# Altium footprint library Package_QFP.PcbLib: 84 footprints (part 5 of 6)
Each footprint in its own frame and in the unit in brackets; x right, y up, seen from the top. Pads: shape width x height; smd on the part's side, far side on the other; paste and mask are expansions set on the pad; w line width, h text height; cw(c..) or ccw(c..) is an arc to the next point about the centre after c.
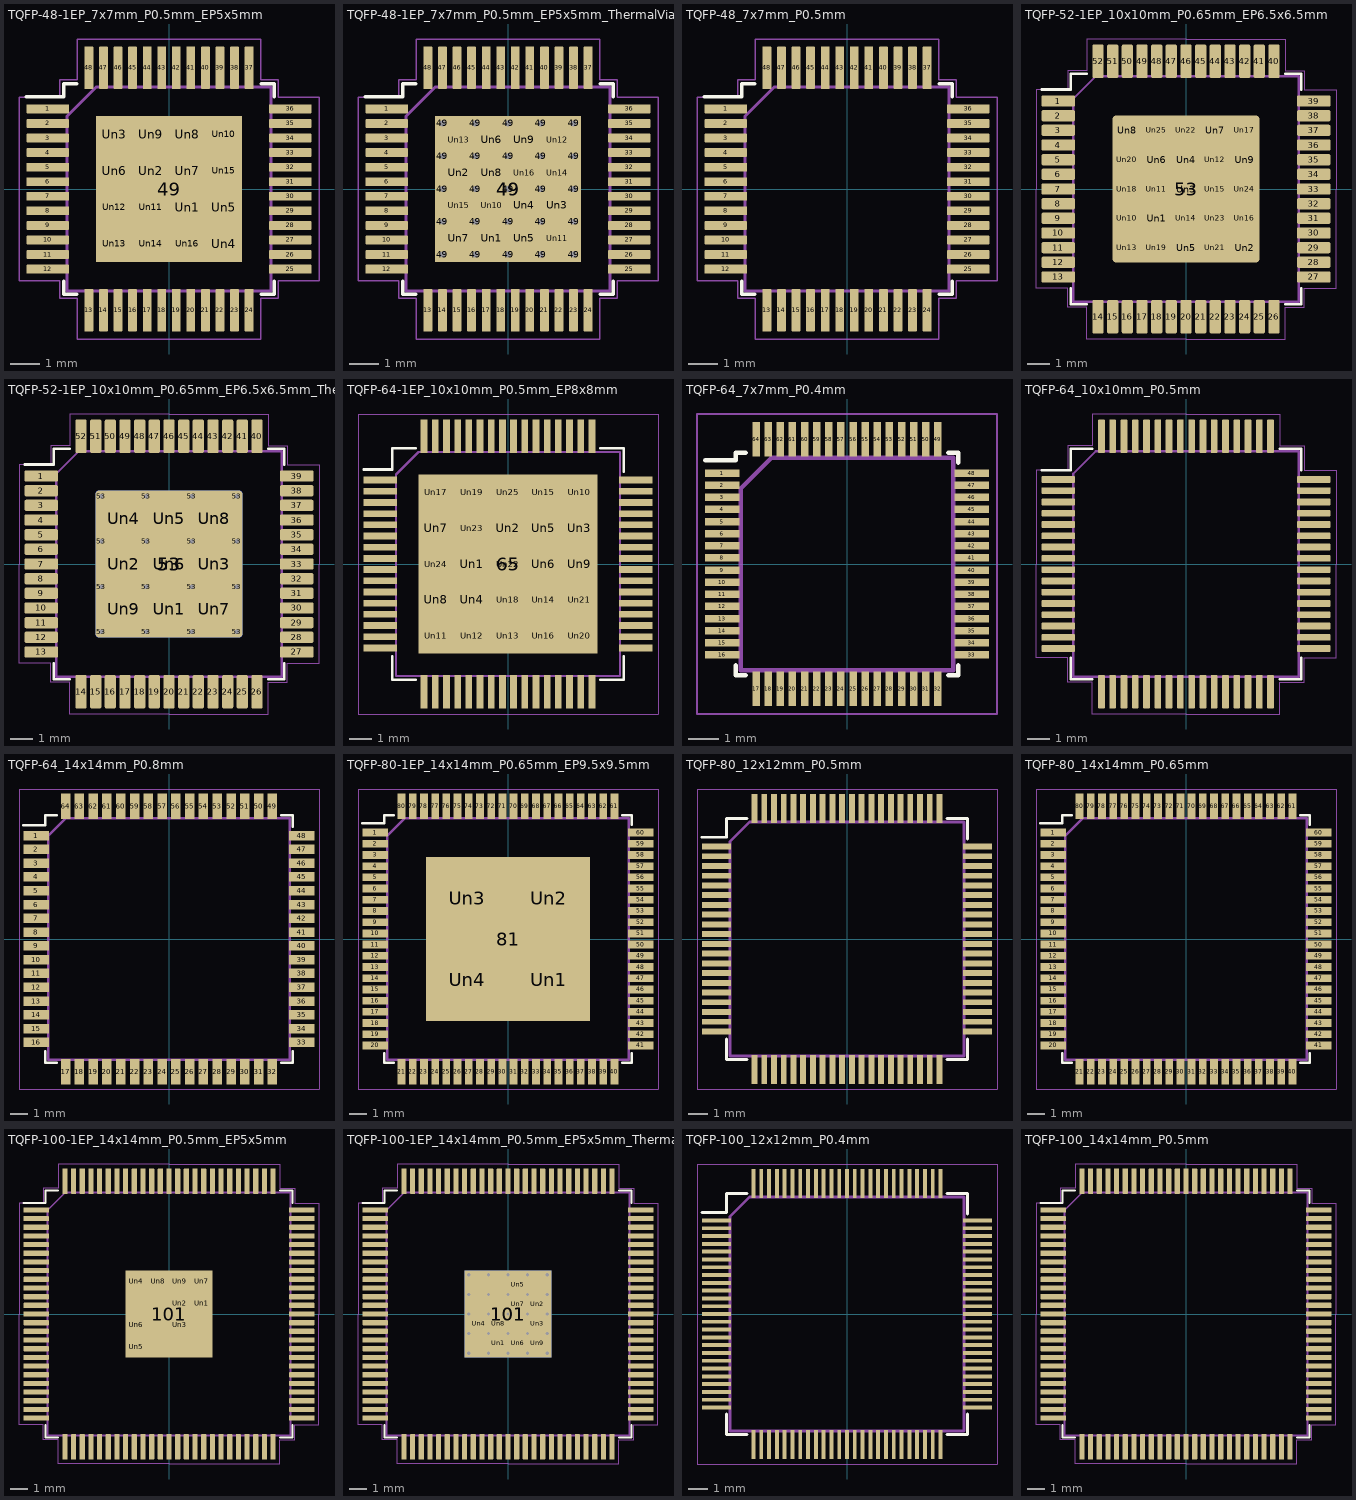
[diagram p4: the footprints below, top view; thin cyan lines are the x and y axes]

## TQFP-48-1EP_7x7mm_P0.5mm_EP5x5mm [mm]
pads (65):
  rrect25% 1.475x0.3 smd: 1(-4.163,2.75) 2(-4.163,2.25) 3(-4.163,1.75) 4(-4.163,1.25) 5(-4.163,0.75) 6(-4.163,0.25) 7(-4.163,-0.25) 8(-4.163,-0.75) 9(-4.163,-1.25) 10(-4.163,-1.75) 11(-4.163,-2.25) 12(-4.163,-2.75) 25(4.163,-2.75) 26(4.163,-2.25) 27(4.163,-1.75) 28(4.163,-1.25) 29(4.163,-0.75) 30(4.163,-0.25) 31(4.163,0.25) 32(4.163,0.75) 33(4.163,1.25) 34(4.163,1.75) 35(4.163,2.25) 36(4.163,2.75)
  rrect25% 0.3x1.475 smd: 13(-2.75,-4.163) 14(-2.25,-4.163) 15(-1.75,-4.163) 16(-1.25,-4.163) 17(-0.75,-4.163) 18(-0.25,-4.163) 19(0.25,-4.163) 20(0.75,-4.163) 21(1.25,-4.163) 22(1.75,-4.163) 23(2.25,-4.163) 24(2.75,-4.163) 37(2.75,4.163) 38(2.25,4.163) 39(1.75,4.163) 40(1.25,4.163) 41(0.75,4.163) 42(0.25,4.163) 43(-0.25,4.163) 44(-0.75,4.163) 45(-1.25,4.163) 46(-1.75,4.163) 47(-2.25,4.163) 48(-2.75,4.163)
  rect 5x5 smd: 49(0,0)
  rrect25% 1.01x1.01 on Top Paste: Un1(0.625,-0.625) Un2(-0.625,0.625) Un3(-1.875,1.875) Un4(1.875,-1.875) Un5(1.875,-0.625) Un6(-1.875,0.625) Un7(0.625,0.625) Un8(0.625,1.875) Un9(-0.625,1.875) Un10(1.875,1.875) Un11(-0.625,-0.625) Un12(-1.875,-0.625) Un13(-1.875,-1.875) Un14(-0.625,-1.875) Un15(1.875,0.625) Un16(0.625,-1.875)
F.SilkS:
  lines w0.12: -4.9,3.16 -3.61,3.16 -3.61,3.61 -3.16,3.61 ; -3.61,-3.16 -3.61,-3.61 -3.16,-3.61 ; 3.16,-3.61 3.61,-3.61 3.61,-3.16 ; 3.16,3.61 3.61,3.61 3.61,3.16
F.CrtYd:
  lines w0.05: -5.15,-3.15 -5.15,0 -5.15,3.15 -3.75,3.15 -3.75,3.75 -3.15,3.75 -3.15,5.15 0,5.15 3.15,5.15 3.15,3.75 3.75,3.75 3.75,3.15 5.15,3.15 5.15,0 5.15,-3.15 3.75,-3.15 3.75,-3.75 3.15,-3.75 3.15,-5.15 0,-5.15 -3.15,-5.15 -3.15,-3.75 -3.75,-3.75 -3.75,-3.15 -5.15,-3.15
F.Fab:
  lines w0.1: -3.5,-3.5 3.5,-3.5 3.5,3.5 -2.5,3.5 -3.5,2.5 -3.5,-3.5
  text "'.Designator'" at -4.047,-0.84 h1

## TQFP-48-1EP_7x7mm_P0.5mm_EP5x5mm_ThermalVias [mm]
pads (91):
  rrect25% 1.475x0.3 smd: 1(-4.163,2.75) 2(-4.163,2.25) 3(-4.163,1.75) 4(-4.163,1.25) 5(-4.163,0.75) 6(-4.163,0.25) 7(-4.163,-0.25) 8(-4.163,-0.75) 9(-4.163,-1.25) 10(-4.163,-1.75) 11(-4.163,-2.25) 12(-4.163,-2.75) 25(4.163,-2.75) 26(4.163,-2.25) 27(4.163,-1.75) 28(4.163,-1.25) 29(4.163,-0.75) 30(4.163,-0.25) 31(4.163,0.25) 32(4.163,0.75) 33(4.163,1.25) 34(4.163,1.75) 35(4.163,2.25) 36(4.163,2.75)
  rrect25% 0.3x1.475 smd: 13(-2.75,-4.163) 14(-2.25,-4.163) 15(-1.75,-4.163) 16(-1.25,-4.163) 17(-0.75,-4.163) 18(-0.25,-4.163) 19(0.25,-4.163) 20(0.75,-4.163) 21(1.25,-4.163) 22(1.75,-4.163) 23(2.25,-4.163) 24(2.75,-4.163) 37(2.75,4.163) 38(2.25,4.163) 39(1.75,4.163) 40(1.25,4.163) 41(0.75,4.163) 42(0.25,4.163) 43(-0.25,4.163) 44(-0.75,4.163) 45(-1.25,4.163) 46(-1.75,4.163) 47(-2.25,4.163) 48(-2.75,4.163)
  round 0.5 hole 0.2: 49(-2.25,-2.25) 49(-2.25,-1.125) 49(-2.25,0) 49(-2.25,1.125) 49(-2.25,2.25) 49(-1.125,-2.25) 49(-1.125,-1.125) 49(-1.125,0) 49(-1.125,1.125) 49(-1.125,2.25) 49(0,-2.25) 49(0,-1.125) 49(0,0) 49(0,1.125) 49(0,2.25) 49(1.125,-2.25) 49(1.125,-1.125) 49(1.125,0) 49(1.125,1.125) 49(1.125,2.25) 49(2.25,-2.25) 49(2.25,-1.125) 49(2.25,0) 49(2.25,1.125) 49(2.25,2.25)
  rect 5x5 smd: 49(0,0)
  rect 5x5 smd far side: 49(0,0)
  round 0.891 on Top Paste: Un1(-0.563,-1.687) Un2(-1.687,0.563) Un3(1.687,-0.563) Un4(0.563,-0.563) Un5(0.563,-1.687) Un6(-0.563,1.687) Un7(-1.687,-1.687) Un8(-0.563,0.563) Un9(0.563,1.687) Un10(-0.563,-0.563) Un11(1.687,-1.687) Un12(1.687,1.687) Un13(-1.687,1.687) Un14(1.687,0.563) Un15(-1.687,-0.563) Un16(0.563,0.563)
F.SilkS:
  lines w0.12: -4.9,3.16 -3.61,3.16 -3.61,3.61 -3.16,3.61 ; -3.61,-3.16 -3.61,-3.61 -3.16,-3.61 ; 3.16,-3.61 3.61,-3.61 3.61,-3.16 ; 3.16,3.61 3.61,3.61 3.61,3.16
F.Paste:
  region: 0.949,0.852 0.949,0.273 0.852,0.176 0.273,0.176 0.176,0.273 0.176,0.852 0.273,0.949 0.852,0.949
  region: -1.301,-0.273 -1.301,-0.852 -1.398,-0.949 -1.977,-0.949 -2.074,-0.852 -2.074,-0.273 -1.977,-0.176 -1.398,-0.176
  region: 2.074,0.852 2.074,0.273 1.977,0.176 1.398,0.176 1.301,0.273 1.301,0.852 1.398,0.949 1.977,0.949
  region: -1.301,1.977 -1.301,1.398 -1.398,1.301 -1.977,1.301 -2.074,1.398 -2.074,1.977 -1.977,2.074 -1.398,2.074
  region: 2.074,1.977 2.074,1.398 1.977,1.301 1.398,1.301 1.301,1.398 1.301,1.977 1.398,2.074 1.977,2.074
  region: 2.074,-1.398 2.074,-1.977 1.977,-2.074 1.398,-2.074 1.301,-1.977 1.301,-1.398 1.398,-1.301 1.977,-1.301
  region: -0.176,-0.273 -0.176,-0.852 -0.273,-0.949 -0.852,-0.949 -0.949,-0.852 -0.949,-0.273 -0.852,-0.176 -0.273,-0.176
  region: 0.949,1.977 0.949,1.398 0.852,1.301 0.273,1.301 0.176,1.398 0.176,1.977 0.273,2.074 0.852,2.074
  region: -0.176,0.852 -0.176,0.273 -0.273,0.176 -0.852,0.176 -0.949,0.273 -0.949,0.852 -0.852,0.949 -0.273,0.949
  region: -1.301,-1.398 -1.301,-1.977 -1.398,-2.074 -1.977,-2.074 -2.074,-1.977 -2.074,-1.398 -1.977,-1.301 -1.398,-1.301
  region: -0.176,1.977 -0.176,1.398 -0.273,1.301 -0.852,1.301 -0.949,1.398 -0.949,1.977 -0.852,2.074 -0.273,2.074
  region: 0.949,-1.398 0.949,-1.977 0.852,-2.074 0.273,-2.074 0.176,-1.977 0.176,-1.398 0.273,-1.301 0.852,-1.301
  region: 0.949,-0.273 0.949,-0.852 0.852,-0.949 0.273,-0.949 0.176,-0.852 0.176,-0.273 0.273,-0.176 0.852,-0.176
  region: 2.074,-0.273 2.074,-0.852 1.977,-0.949 1.398,-0.949 1.301,-0.852 1.301,-0.273 1.398,-0.176 1.977,-0.176
  region: -1.301,0.852 -1.301,0.273 -1.398,0.176 -1.977,0.176 -2.074,0.273 -2.074,0.852 -1.977,0.949 -1.398,0.949
  region: -0.176,-1.398 -0.176,-1.977 -0.273,-2.074 -0.852,-2.074 -0.949,-1.977 -0.949,-1.398 -0.852,-1.301 -0.273,-1.301
F.CrtYd:
  lines w0.05: -5.15,-3.15 -3.75,-3.15 -3.75,-3.75 -3.15,-3.75 -3.15,-5.15 0,-5.15 3.15,-5.15 3.15,-3.75 3.75,-3.75 3.75,-3.15 5.15,-3.15 5.15,0 5.15,3.15 3.75,3.15 3.75,3.75 3.15,3.75 3.15,5.15 0,5.15 -3.15,5.15 -3.15,3.75 -3.75,3.75 -3.75,3.15 -5.15,3.15 -5.15,0 -5.15,-3.15
F.Fab:
  lines w0.1: -3.5,-3.5 3.5,-3.5 3.5,3.5 -2.5,3.5 -3.5,2.5 -3.5,-3.5
  text "'.Designator'" at -4.047,-0.84 h1

## TQFP-48_7x7mm_P0.5mm [mm]
pads (48):
  rrect25% 1.475x0.3 smd mask+0.051: 1(-4.163,2.75) 2(-4.163,2.25) 3(-4.163,1.75) 4(-4.163,1.25) 5(-4.163,0.75) 6(-4.163,0.25) 7(-4.163,-0.25) 8(-4.163,-0.75) 9(-4.163,-1.25) 10(-4.163,-1.75) 11(-4.163,-2.25) 12(-4.163,-2.75) 25(4.163,-2.75) 26(4.163,-2.25) 27(4.163,-1.75) 28(4.163,-1.25) 29(4.163,-0.75) 30(4.163,-0.25) 31(4.163,0.25) 32(4.163,0.75) 33(4.163,1.25) 34(4.163,1.75) 35(4.163,2.25) 36(4.163,2.75)
  rrect25% 0.3x1.475 smd mask+0.051: 13(-2.75,-4.163) 14(-2.25,-4.163) 15(-1.75,-4.163) 16(-1.25,-4.163) 17(-0.75,-4.163) 18(-0.25,-4.163) 19(0.25,-4.163) 20(0.75,-4.163) 21(1.25,-4.163) 22(1.75,-4.163) 23(2.25,-4.163) 24(2.75,-4.163) 37(2.75,4.163) 38(2.25,4.163) 39(1.75,4.163) 40(1.25,4.163) 41(0.75,4.163) 42(0.25,4.163) 43(-0.25,4.163) 44(-0.75,4.163) 45(-1.25,4.163) 46(-1.75,4.163) 47(-2.25,4.163) 48(-2.75,4.163)
F.SilkS:
  lines w0.12: -4.9,3.16 -3.61,3.16 -3.61,3.61 -3.16,3.61 ; -3.61,-3.16 -3.61,-3.61 -3.16,-3.61 ; 3.16,-3.61 3.61,-3.61 3.61,-3.16 ; 3.16,3.61 3.61,3.61 3.61,3.16
F.CrtYd:
  lines w0.05: -5.15,-3.15 -3.75,-3.15 -3.75,-3.75 -3.15,-3.75 -3.15,-5.15 0,-5.15 3.15,-5.15 3.15,-3.75 3.75,-3.75 3.75,-3.15 5.15,-3.15 5.15,0 5.15,3.15 3.75,3.15 3.75,3.75 3.15,3.75 3.15,5.15 0,5.15 -3.15,5.15 -3.15,3.75 -3.75,3.75 -3.75,3.15 -5.15,3.15 -5.15,0 -5.15,-3.15
F.Fab:
  lines w0.1: -3.5,-3.5 -3.5,2.5 -2.5,3.5 3.5,3.5 3.5,-3.5 -3.5,-3.5
  text "'.Designator'" at -4.047,-0.84 h1

## TQFP-52-1EP_10x10mm_P0.65mm_EP6.5x6.5mm [mm]
pads (78):
  rrect25% 1.475x0.5 smd: 1(-5.663,3.9) 2(-5.663,3.25) 3(-5.663,2.6) 4(-5.663,1.95) 5(-5.663,1.3) 6(-5.663,0.65) 7(-5.663,0) 8(-5.663,-0.65) 9(-5.663,-1.3) 10(-5.663,-1.95) 11(-5.663,-2.6) 12(-5.663,-3.25) 13(-5.663,-3.9) 27(5.663,-3.9) 28(5.663,-3.25) 29(5.663,-2.6) 30(5.663,-1.95) 31(5.663,-1.3) 32(5.663,-0.65) 33(5.663,0) 34(5.663,0.65) 35(5.663,1.3) 36(5.663,1.95) 37(5.663,2.6) 38(5.663,3.25) 39(5.663,3.9)
  rrect25% 0.5x1.475 smd: 14(-3.9,-5.663) 15(-3.25,-5.663) 16(-2.6,-5.663) 17(-1.95,-5.663) 18(-1.3,-5.663) 19(-0.65,-5.663) 20(0,-5.663) 21(0.65,-5.663) 22(1.3,-5.663) 23(1.95,-5.663) 24(2.6,-5.663) 25(3.25,-5.663) 26(3.9,-5.663) 40(3.9,5.663) 41(3.25,5.663) 42(2.6,5.663) 43(1.95,5.663) 44(1.3,5.663) 45(0.65,5.663) 46(0,5.663) 47(-0.65,5.663) 48(-1.3,5.663) 49(-1.95,5.663) 50(-2.6,5.663) 51(-3.25,5.663) 52(-3.9,5.663)
  rrect4% 6.5x6.5 smd: 53(0,0)
  rrect24% 1.05x1.05 on Top Paste: Un1(-1.3,-1.3) Un2(2.6,-2.6) Un3(0,0) Un4(0,1.3) Un5(0,-2.6) Un6(-1.3,1.3) Un7(1.3,2.6) Un8(-2.6,2.6) Un9(2.6,1.3) Un10(-2.6,-1.3) Un11(-1.3,0) Un12(1.3,1.3) Un13(-2.6,-2.6) Un14(0,-1.3) Un15(1.3,0) Un16(2.6,-1.3) Un17(2.6,2.6) Un18(-2.6,0) Un19(-1.3,-2.6) Un20(-2.6,1.3) Un21(1.3,-2.6) Un22(0,2.6) Un23(1.3,-1.3) Un24(2.6,0) Un25(-1.3,2.6)
F.SilkS:
  lines w0.12: -6.4,4.41 -5.11,4.41 -5.11,5.11 -4.41,5.11 ; -5.11,-4.41 -5.11,-5.11 -4.41,-5.11 ; 4.41,-5.11 5.11,-5.11 5.11,-4.41 ; 4.41,5.11 5.11,5.11 5.11,4.41
F.CrtYd:
  lines w0.05: -6.65,-4.4 -6.65,0 -6.65,4.4 -5.25,4.4 -5.25,5.25 -4.4,5.25 -4.4,6.65 0,6.65 4.4,6.65 4.4,5.25 5.25,5.25 5.25,4.4 6.65,4.4 6.65,0 6.65,-4.4 5.25,-4.4 5.25,-5.25 4.4,-5.25 4.4,-6.65 0,-6.65 -4.4,-6.65 -4.4,-5.25 -5.25,-5.25 -5.25,-4.4 -6.65,-4.4
F.Fab:
  lines w0.1: -5,-5 -5,4 -4,5 5,5 5,-5 -5,-5
  text "'.Designator'" at -4.047,-0.84 h1

## TQFP-52-1EP_10x10mm_P0.65mm_EP6.5x6.5mm_ThermalVias [mm]
pads (79):
  rrect25% 1.475x0.5 smd: 1(-5.663,3.9) 2(-5.663,3.25) 3(-5.663,2.6) 4(-5.663,1.95) 5(-5.663,1.3) 6(-5.663,0.65) 7(-5.663,0) 8(-5.663,-0.65) 9(-5.663,-1.3) 10(-5.663,-1.95) 11(-5.663,-2.6) 12(-5.663,-3.25) 13(-5.663,-3.9) 27(5.663,-3.9) 28(5.663,-3.25) 29(5.663,-2.6) 30(5.663,-1.95) 31(5.663,-1.3) 32(5.663,-0.65) 33(5.663,0) 34(5.663,0.65) 35(5.663,1.3) 36(5.663,1.95) 37(5.663,2.6) 38(5.663,3.25) 39(5.663,3.9)
  rrect25% 0.5x1.475 smd: 14(-3.9,-5.663) 15(-3.25,-5.663) 16(-2.6,-5.663) 17(-1.95,-5.663) 18(-1.3,-5.663) 19(-0.65,-5.663) 20(0,-5.663) 21(0.65,-5.663) 22(1.3,-5.663) 23(1.95,-5.663) 24(2.6,-5.663) 25(3.25,-5.663) 26(3.9,-5.663) 40(3.9,5.663) 41(3.25,5.663) 42(2.6,5.663) 43(1.95,5.663) 44(1.3,5.663) 45(0.65,5.663) 46(0,5.663) 47(-0.65,5.663) 48(-1.3,5.663) 49(-1.95,5.663) 50(-2.6,5.663) 51(-3.25,5.663) 52(-3.9,5.663)
  round 0.5 hole 0.2: 53(-3,-3) 53(-3,-1) 53(-3,1) 53(-3,3) 53(-1,-3) 53(-1,-1) 53(-1,1) 53(-1,3) 53(1,-3) 53(1,-1) 53(1,1) 53(1,3) 53(3,-3) 53(3,-1) 53(3,1) 53(3,3)
  rrect4% 6.5x6.5 smd far side: 53(0,0)
  rrect4% 6.5x6.5 smd: 53(0,0)
  rrect14% 1.747x1.747 on Top Paste: Un1(0,-2) Un2(-2,0) Un3(2,0) Un4(-2,2) Un5(0,2) Un6(0,0) Un7(2,-2) Un8(2,2) Un9(-2,-2)
F.SilkS:
  lines w0.12: -6.4,4.41 -5.11,4.41 -5.11,5.11 -4.41,5.11 ; -5.11,-4.41 -5.11,-5.11 -4.41,-5.11 ; 4.41,-5.11 5.11,-5.11 5.11,-4.41 ; 4.41,5.11 5.11,5.11 5.11,4.41
F.CrtYd:
  lines w0.05: -6.65,-4.4 -6.65,0 -6.65,4.4 -5.25,4.4 -5.25,5.25 -4.4,5.25 -4.4,6.65 0,6.65 4.4,6.65 4.4,5.25 5.25,5.25 5.25,4.4 6.65,4.4 6.65,0 6.65,-4.4 5.25,-4.4 5.25,-5.25 4.4,-5.25 4.4,-6.65 0,-6.65 -4.4,-6.65 -4.4,-5.25 -5.25,-5.25 -5.25,-4.4 -6.65,-4.4
F.Fab:
  lines w0.1: -5,-5 5,-5 5,5 -4,5 -5,4 -5,-5
  text "'.Designator'" at -4.047,-0.84 h1

## TQFP-64-1EP_10x10mm_P0.5mm_EP8x8mm [mm]
pads (90):
  rect 1.5x0.3 smd: 1(-5.7,3.75) 2(-5.7,3.25) 3(-5.7,2.75) 4(-5.7,2.25) 5(-5.7,1.75) 6(-5.7,1.25) 7(-5.7,0.75) 8(-5.7,0.25) 9(-5.7,-0.25) 10(-5.7,-0.75) 11(-5.7,-1.25) 12(-5.7,-1.75) 13(-5.7,-2.25) 14(-5.7,-2.75) 15(-5.7,-3.25) 16(-5.7,-3.75) 33(5.7,-3.75) 34(5.7,-3.25) 35(5.7,-2.75) 36(5.7,-2.25) 37(5.7,-1.75) 38(5.7,-1.25) 39(5.7,-0.75) 40(5.7,-0.25) 41(5.7,0.25) 42(5.7,0.75) 43(5.7,1.25) 44(5.7,1.75) 45(5.7,2.25) 46(5.7,2.75) 47(5.7,3.25) 48(5.7,3.75)
  rect 0.3x1.5 smd: 17(-3.75,-5.7) 18(-3.25,-5.7) 19(-2.75,-5.7) 20(-2.25,-5.7) 21(-1.75,-5.7) 22(-1.25,-5.7) 23(-0.75,-5.7) 24(-0.25,-5.7) 25(0.25,-5.7) 26(0.75,-5.7) 27(1.25,-5.7) 28(1.75,-5.7) 29(2.25,-5.7) 30(2.75,-5.7) 31(3.25,-5.7) 32(3.75,-5.7) 49(3.75,5.7) 50(3.25,5.7) 51(2.75,5.7) 52(2.25,5.7) 53(1.75,5.7) 54(1.25,5.7) 55(0.75,5.7) 56(0.25,5.7) 57(-0.25,5.7) 58(-0.75,5.7) 59(-1.25,5.7) 60(-1.75,5.7) 61(-2.25,5.7) 62(-2.75,5.7) 63(-3.25,5.7) 64(-3.75,5.7)
  rect 8x8 smd: 65(0,0)
  rect 1.24x1.24 on Top Paste: Un1(-1.6,0) Un2(0,1.6) Un3(3.2,1.6) Un4(-1.6,-1.6) Un5(1.6,1.6) Un6(1.6,0) Un7(-3.2,1.6) Un8(-3.2,-1.6) Un9(3.2,0) Un10(3.2,3.2) Un11(-3.2,-3.2) Un12(-1.6,-3.2) Un13(0,-3.2) Un14(1.6,-1.6) Un15(1.6,3.2) Un16(1.6,-3.2) Un17(-3.2,3.2) Un18(0,-1.6) Un19(-1.6,3.2) Un20(3.2,-3.2) Un21(3.2,-1.6) Un22(0,0) Un23(-1.6,1.6) Un24(-3.2,0) Un25(0,3.2)
F.SilkS:
  lines w0.12: -6.45,4.225 -5.175,4.225 -5.175,5.175 -4.125,5.175 ; -5.175,-4.125 -5.175,-5.175 -4.125,-5.175 ; 4.125,-5.175 5.175,-5.175 5.175,-4.125 ; 4.125,5.175 5.175,5.175 5.175,4.125
F.CrtYd:
  lines w0.05: -6.7,-6.7 6.7,-6.7 6.7,6.7 -6.7,6.7 -6.7,-6.7
F.Fab:
  lines w0.1: -5,-5 5,-5 5,5 -4,5 -5,4 -5,-5
  text "'.Designator'" at -4.047,-0.84 h1

## TQFP-64_7x7mm_P0.4mm [mm]
pads (64):
  rect 1.13x0.25 smd: 1(-4.115,3) 2(-4.115,2.6) 3(-4.115,2.2) 4(-4.115,1.8) 5(-4.115,1.4) 6(-4.115,1) 7(-4.115,0.6) 8(-4.115,0.2) 9(-4.115,-0.2) 10(-4.115,-0.6) 11(-4.115,-1) 12(-4.115,-1.4) 13(-4.115,-1.8) 14(-4.115,-2.2) 15(-4.115,-2.6) 16(-4.115,-3) 33(4.115,-3) 34(4.115,-2.6) 35(4.115,-2.2) 36(4.115,-1.8) 37(4.115,-1.4) 38(4.115,-1) 39(4.115,-0.6) 40(4.115,-0.2) 41(4.115,0.2) 42(4.115,0.6) 43(4.115,1) 44(4.115,1.4) 45(4.115,1.8) 46(4.115,2.2) 47(4.115,2.6) 48(4.115,3)
  rect 0.25x1.13 smd: 17(-3,-4.115) 18(-2.6,-4.115) 19(-2.2,-4.115) 20(-1.8,-4.115) 21(-1.4,-4.115) 22(-1,-4.115) 23(-0.6,-4.115) 24(-0.2,-4.115) 25(0.2,-4.115) 26(0.6,-4.115) 27(1,-4.115) 28(1.4,-4.115) 29(1.8,-4.115) 30(2.2,-4.115) 31(2.6,-4.115) 32(3,-4.115) 49(3,4.115) 50(2.6,4.115) 51(2.2,4.115) 52(1.8,4.115) 53(1.4,4.115) 54(1,4.115) 55(0.6,4.115) 56(0.2,4.115) 57(-0.2,4.115) 58(-0.6,4.115) 59(-1,4.115) 60(-1.4,4.115) 61(-1.8,4.115) 62(-2.2,4.115) 63(-2.6,4.115) 64(-3,4.115)
F.SilkS:
  lines w0.15: -4.68,3.425 -3.675,3.425 -3.675,3.675 -3.35,3.675 ; -3.675,-3.35 -3.675,-3.675 -3.35,-3.675 ; 3.35,-3.675 3.675,-3.675 3.675,-3.35 ; 3.35,3.675 3.675,3.675 3.675,3.35
F.CrtYd:
  lines w0.05: -4.95,-4.95 -4.95,4.95 4.95,4.95 4.95,-4.95 -4.95,-4.95
F.Fab:
  lines w0.15: -3.5,-3.5 3.5,-3.5 3.5,3.5 -2.5,3.5 -3.5,2.5 -3.5,-3.5
  text "'.Designator'" at -4.047,-0.84 h1

## TQFP-64_10x10mm_P0.5mm [mm]
pads (64):
  rrect25% 1.475x0.3 smd: 1(-5.663,3.75) 2(-5.663,3.25) 3(-5.663,2.75) 4(-5.663,2.25) 5(-5.663,1.75) 6(-5.663,1.25) 7(-5.663,0.75) 8(-5.663,0.25) 9(-5.663,-0.25) 10(-5.663,-0.75) 11(-5.663,-1.25) 12(-5.663,-1.75) 13(-5.663,-2.25) 14(-5.663,-2.75) 15(-5.663,-3.25) 16(-5.663,-3.75) 33(5.663,-3.75) 34(5.663,-3.25) 35(5.663,-2.75) 36(5.663,-2.25) 37(5.663,-1.75) 38(5.663,-1.25) 39(5.663,-0.75) 40(5.663,-0.25) 41(5.663,0.25) 42(5.663,0.75) 43(5.663,1.25) 44(5.663,1.75) 45(5.663,2.25) 46(5.663,2.75) 47(5.663,3.25) 48(5.663,3.75)
  rrect25% 0.3x1.475 smd: 17(-3.75,-5.663) 18(-3.25,-5.663) 19(-2.75,-5.663) 20(-2.25,-5.663) 21(-1.75,-5.663) 22(-1.25,-5.663) 23(-0.75,-5.663) 24(-0.25,-5.663) 25(0.25,-5.663) 26(0.75,-5.663) 27(1.25,-5.663) 28(1.75,-5.663) 29(2.25,-5.663) 30(2.75,-5.663) 31(3.25,-5.663) 32(3.75,-5.663) 49(3.75,5.663) 50(3.25,5.663) 51(2.75,5.663) 52(2.25,5.663) 53(1.75,5.663) 54(1.25,5.663) 55(0.75,5.663) 56(0.25,5.663) 57(-0.25,5.663) 58(-0.75,5.663) 59(-1.25,5.663) 60(-1.75,5.663) 61(-2.25,5.663) 62(-2.75,5.663) 63(-3.25,5.663) 64(-3.75,5.663)
F.SilkS:
  lines w0.12: -6.4,4.16 -5.11,4.16 -5.11,5.11 -4.16,5.11 ; -5.11,-4.16 -5.11,-5.11 -4.16,-5.11 ; 4.16,-5.11 5.11,-5.11 5.11,-4.16 ; 4.16,5.11 5.11,5.11 5.11,4.16
F.CrtYd:
  lines w0.05: -6.65,-4.15 -5.25,-4.15 -5.25,-5.25 -4.15,-5.25 -4.15,-6.65 0,-6.65 4.15,-6.65 4.15,-5.25 5.25,-5.25 5.25,-4.15 6.65,-4.15 6.65,0 6.65,4.15 5.25,4.15 5.25,5.25 4.15,5.25 4.15,6.65 0,6.65 -4.15,6.65 -4.15,5.25 -5.25,5.25 -5.25,4.15 -6.65,4.15 -6.65,0 -6.65,-4.15
F.Fab:
  lines w0.1: -5,-5 -5,4 -4,5 5,5 5,-5 -5,-5
  text "'.Designator'" at -4.047,-0.84 h1

## TQFP-64_14x14mm_P0.8mm [mm]
pads (64):
  rect 1.5x0.55 smd: 1(-7.7,6) 2(-7.7,5.2) 3(-7.7,4.4) 4(-7.7,3.6) 5(-7.7,2.8) 6(-7.7,2) 7(-7.7,1.2) 8(-7.7,0.4) 9(-7.7,-0.4) 10(-7.7,-1.2) 11(-7.7,-2) 12(-7.7,-2.8) 13(-7.7,-3.6) 14(-7.7,-4.4) 15(-7.7,-5.2) 16(-7.7,-6) 33(7.7,-6) 34(7.7,-5.2) 35(7.7,-4.4) 36(7.7,-3.6) 37(7.7,-2.8) 38(7.7,-2) 39(7.7,-1.2) 40(7.7,-0.4) 41(7.7,0.4) 42(7.7,1.2) 43(7.7,2) 44(7.7,2.8) 45(7.7,3.6) 46(7.7,4.4) 47(7.7,5.2) 48(7.7,6)
  rect 0.55x1.5 smd: 17(-6,-7.7) 18(-5.2,-7.7) 19(-4.4,-7.7) 20(-3.6,-7.7) 21(-2.8,-7.7) 22(-2,-7.7) 23(-1.2,-7.7) 24(-0.4,-7.7) 25(0.4,-7.7) 26(1.2,-7.7) 27(2,-7.7) 28(2.8,-7.7) 29(3.6,-7.7) 30(4.4,-7.7) 31(5.2,-7.7) 32(6,-7.7) 49(6,7.7) 50(5.2,7.7) 51(4.4,7.7) 52(3.6,7.7) 53(2.8,7.7) 54(2,7.7) 55(1.2,7.7) 56(0.4,7.7) 57(-0.4,7.7) 58(-1.2,7.7) 59(-2,7.7) 60(-2.8,7.7) 61(-3.6,7.7) 62(-4.4,7.7) 63(-5.2,7.7) 64(-6,7.7)
F.SilkS:
  lines w0.15: -8.45,6.6 -7.175,6.6 -7.175,7.175 -6.5,7.175 ; -7.175,-6.5 -7.175,-7.175 -6.5,-7.175 ; 6.5,-7.175 7.175,-7.175 7.175,-6.5 ; 6.5,7.175 7.175,7.175 7.175,6.5
F.CrtYd:
  lines w0.05: -8.7,-8.7 -8.7,8.7 8.7,8.7 8.7,-8.7 -8.7,-8.7
F.Fab:
  lines w0.15: -7,-7 7,-7 7,7 -6,7 -7,6 -7,-7
  text "'.Designator'" at -4.047,-0.84 h1

## TQFP-80-1EP_14x14mm_P0.65mm_EP9.5x9.5mm [mm]
pads (85):
  rect 1.5x0.45 smd: 1(-7.7,6.175) 2(-7.7,5.525) 3(-7.7,4.875) 4(-7.7,4.225) 5(-7.7,3.575) 6(-7.7,2.925) 7(-7.7,2.275) 8(-7.7,1.625) 9(-7.7,0.975) 10(-7.7,0.325) 11(-7.7,-0.325) 12(-7.7,-0.975) 13(-7.7,-1.625) 14(-7.7,-2.275) 15(-7.7,-2.925) 16(-7.7,-3.575) 17(-7.7,-4.225) 18(-7.7,-4.875) 19(-7.7,-5.525) 20(-7.7,-6.175) 41(7.7,-6.175) 42(7.7,-5.525) 43(7.7,-4.875) 44(7.7,-4.225) 45(7.7,-3.575) 46(7.7,-2.925) 47(7.7,-2.275) 48(7.7,-1.625) 49(7.7,-0.975) 50(7.7,-0.325) 51(7.7,0.325) 52(7.7,0.975) 53(7.7,1.625) 54(7.7,2.275) 55(7.7,2.925) 56(7.7,3.575) 57(7.7,4.225) 58(7.7,4.875) 59(7.7,5.525) 60(7.7,6.175)
  rect 0.45x1.5 smd: 21(-6.175,-7.7) 22(-5.525,-7.7) 23(-4.875,-7.7) 24(-4.225,-7.7) 25(-3.575,-7.7) 26(-2.925,-7.7) 27(-2.275,-7.7) 28(-1.625,-7.7) 29(-0.975,-7.7) 30(-0.325,-7.7) 31(0.325,-7.7) 32(0.975,-7.7) 33(1.625,-7.7) 34(2.275,-7.7) 35(2.925,-7.7) 36(3.575,-7.7) 37(4.225,-7.7) 38(4.875,-7.7) 39(5.525,-7.7) 40(6.175,-7.7) 61(6.175,7.7) 62(5.525,7.7) 63(4.875,7.7) 64(4.225,7.7) 65(3.575,7.7) 66(2.925,7.7) 67(2.275,7.7) 68(1.625,7.7) 69(0.975,7.7) 70(0.325,7.7) 71(-0.325,7.7) 72(-0.975,7.7) 73(-1.625,7.7) 74(-2.275,7.7) 75(-2.925,7.7) 76(-3.575,7.7) 77(-4.225,7.7) 78(-4.875,7.7) 79(-5.525,7.7) 80(-6.175,7.7)
  rect 9.5x9.5 smd: 81(0,0)
  rect 3.8x3.8 on Top Paste: Un1(2.375,-2.375) Un2(2.375,2.375) Un3(-2.375,2.375) Un4(-2.375,-2.375)
F.SilkS:
  lines w0.15: -8.45,6.725 -7.175,6.725 -7.175,7.175 -6.625,7.175 ; -7.175,-6.625 -7.175,-7.175 -6.625,-7.175 ; 6.625,-7.175 7.175,-7.175 7.175,-6.625 ; 6.625,7.175 7.175,7.175 7.175,6.625
F.CrtYd:
  lines w0.05: -8.7,-8.7 -8.7,8.7 8.7,8.7 8.7,-8.7 -8.7,-8.7
F.Fab:
  lines w0.15: -7,-7 7,-7 7,7 -6,7 -7,6 -7,-7
  text "'.Designator'" at -4.047,-0.84 h1

## TQFP-80_12x12mm_P0.5mm [mm]
pads (80):
  rect 1.5x0.3 smd: 1(-6.7,4.75) 2(-6.7,4.25) 3(-6.7,3.75) 4(-6.7,3.25) 5(-6.7,2.75) 6(-6.7,2.25) 7(-6.7,1.75) 8(-6.7,1.25) 9(-6.7,0.75) 10(-6.7,0.25) 11(-6.7,-0.25) 12(-6.7,-0.75) 13(-6.7,-1.25) 14(-6.7,-1.75) 15(-6.7,-2.25) 16(-6.7,-2.75) 17(-6.7,-3.25) 18(-6.7,-3.75) 19(-6.7,-4.25) 20(-6.7,-4.75) 41(6.7,-4.75) 42(6.7,-4.25) 43(6.7,-3.75) 44(6.7,-3.25) 45(6.7,-2.75) 46(6.7,-2.25) 47(6.7,-1.75) 48(6.7,-1.25) 49(6.7,-0.75) 50(6.7,-0.25) 51(6.7,0.25) 52(6.7,0.75) 53(6.7,1.25) 54(6.7,1.75) 55(6.7,2.25) 56(6.7,2.75) 57(6.7,3.25) 58(6.7,3.75) 59(6.7,4.25) 60(6.7,4.75)
  rect 0.3x1.5 smd: 21(-4.75,-6.7) 22(-4.25,-6.7) 23(-3.75,-6.7) 24(-3.25,-6.7) 25(-2.75,-6.7) 26(-2.25,-6.7) 27(-1.75,-6.7) 28(-1.25,-6.7) 29(-0.75,-6.7) 30(-0.25,-6.7) 31(0.25,-6.7) 32(0.75,-6.7) 33(1.25,-6.7) 34(1.75,-6.7) 35(2.25,-6.7) 36(2.75,-6.7) 37(3.25,-6.7) 38(3.75,-6.7) 39(4.25,-6.7) 40(4.75,-6.7) 61(4.75,6.7) 62(4.25,6.7) 63(3.75,6.7) 64(3.25,6.7) 65(2.75,6.7) 66(2.25,6.7) 67(1.75,6.7) 68(1.25,6.7) 69(0.75,6.7) 70(0.25,6.7) 71(-0.25,6.7) 72(-0.75,6.7) 73(-1.25,6.7) 74(-1.75,6.7) 75(-2.25,6.7) 76(-2.75,6.7) 77(-3.25,6.7) 78(-3.75,6.7) 79(-4.25,6.7) 80(-4.75,6.7)
F.SilkS:
  lines w0.15: -7.45,5.225 -6.175,5.225 -6.175,6.175 -5.125,6.175 ; -6.175,-5.125 -6.175,-6.175 -5.125,-6.175 ; 5.125,-6.175 6.175,-6.175 6.175,-5.125 ; 5.125,6.175 6.175,6.175 6.175,5.125
F.CrtYd:
  lines w0.05: -7.7,-7.7 7.7,-7.7 7.7,7.7 -7.7,7.7 -7.7,-7.7
F.Fab:
  lines w0.15: -6,-6 6,-6 6,6 -5,6 -6,5 -6,-6
  text "'.Designator'" at -4.047,-0.84 h1

## TQFP-80_14x14mm_P0.65mm [mm]
pads (80):
  rect 1.5x0.45 smd: 1(-7.7,6.175) 2(-7.7,5.525) 3(-7.7,4.875) 4(-7.7,4.225) 5(-7.7,3.575) 6(-7.7,2.925) 7(-7.7,2.275) 8(-7.7,1.625) 9(-7.7,0.975) 10(-7.7,0.325) 11(-7.7,-0.325) 12(-7.7,-0.975) 13(-7.7,-1.625) 14(-7.7,-2.275) 15(-7.7,-2.925) 16(-7.7,-3.575) 17(-7.7,-4.225) 18(-7.7,-4.875) 19(-7.7,-5.525) 20(-7.7,-6.175) 41(7.7,-6.175) 42(7.7,-5.525) 43(7.7,-4.875) 44(7.7,-4.225) 45(7.7,-3.575) 46(7.7,-2.925) 47(7.7,-2.275) 48(7.7,-1.625) 49(7.7,-0.975) 50(7.7,-0.325) 51(7.7,0.325) 52(7.7,0.975) 53(7.7,1.625) 54(7.7,2.275) 55(7.7,2.925) 56(7.7,3.575) 57(7.7,4.225) 58(7.7,4.875) 59(7.7,5.525) 60(7.7,6.175)
  rect 0.45x1.5 smd: 21(-6.175,-7.7) 22(-5.525,-7.7) 23(-4.875,-7.7) 24(-4.225,-7.7) 25(-3.575,-7.7) 26(-2.925,-7.7) 27(-2.275,-7.7) 28(-1.625,-7.7) 29(-0.975,-7.7) 30(-0.325,-7.7) 31(0.325,-7.7) 32(0.975,-7.7) 33(1.625,-7.7) 34(2.275,-7.7) 35(2.925,-7.7) 36(3.575,-7.7) 37(4.225,-7.7) 38(4.875,-7.7) 39(5.525,-7.7) 40(6.175,-7.7) 61(6.175,7.7) 62(5.525,7.7) 63(4.875,7.7) 64(4.225,7.7) 65(3.575,7.7) 66(2.925,7.7) 67(2.275,7.7) 68(1.625,7.7) 69(0.975,7.7) 70(0.325,7.7) 71(-0.325,7.7) 72(-0.975,7.7) 73(-1.625,7.7) 74(-2.275,7.7) 75(-2.925,7.7) 76(-3.575,7.7) 77(-4.225,7.7) 78(-4.875,7.7) 79(-5.525,7.7) 80(-6.175,7.7)
F.SilkS:
  lines w0.15: -8.45,6.725 -7.175,6.725 -7.175,7.175 -6.625,7.175 ; -7.175,-6.625 -7.175,-7.175 -6.625,-7.175 ; 6.625,-7.175 7.175,-7.175 7.175,-6.625 ; 6.625,7.175 7.175,7.175 7.175,6.625
F.CrtYd:
  lines w0.05: -8.7,-8.7 8.7,-8.7 8.7,8.7 -8.7,8.7 -8.7,-8.7
F.Fab:
  lines w0.15: -7,-7 7,-7 7,7 -6,7 -7,6 -7,-7
  text "'.Designator'" at -4.047,-0.84 h1

## TQFP-100-1EP_14x14mm_P0.5mm_EP5x5mm [mm]
pads (117):
  rrect25% 1.475x0.3 smd: 1(-7.662,6) 2(-7.662,5.5) 3(-7.662,5) 4(-7.662,4.5) 5(-7.662,4) 6(-7.662,3.5) 7(-7.662,3) 8(-7.662,2.5) 9(-7.662,2) 10(-7.662,1.5) 11(-7.662,1) 12(-7.662,0.5) 13(-7.662,0) 14(-7.662,-0.5) 15(-7.662,-1) 16(-7.662,-1.5) 17(-7.662,-2) 18(-7.662,-2.5) 19(-7.662,-3) 20(-7.662,-3.5) 21(-7.662,-4) 22(-7.662,-4.5) 23(-7.662,-5) 24(-7.662,-5.5) 25(-7.662,-6) 51(7.662,-6) 52(7.662,-5.5) 53(7.662,-5) 54(7.662,-4.5) 55(7.662,-4) 56(7.662,-3.5) 57(7.662,-3) 58(7.662,-2.5) 59(7.662,-2) 60(7.662,-1.5) 61(7.662,-1) 62(7.662,-0.5) 63(7.662,0) 64(7.662,0.5) 65(7.662,1) 66(7.662,1.5) 67(7.662,2) 68(7.662,2.5) 69(7.662,3) 70(7.662,3.5) 71(7.662,4) 72(7.662,4.5) 73(7.662,5) 74(7.662,5.5) 75(7.662,6)
  rrect25% 0.3x1.475 smd: 26(-6,-7.662) 27(-5.5,-7.662) 28(-5,-7.662) 29(-4.5,-7.662) 30(-4,-7.662) 31(-3.5,-7.662) 32(-3,-7.662) 33(-2.5,-7.662) 34(-2,-7.662) 35(-1.5,-7.662) 36(-1,-7.662) 37(-0.5,-7.662) 38(0,-7.662) 39(0.5,-7.662) 40(1,-7.662) 41(1.5,-7.662) 42(2,-7.662) 43(2.5,-7.662) 44(3,-7.662) 45(3.5,-7.662) 46(4,-7.662) 47(4.5,-7.662) 48(5,-7.662) 49(5.5,-7.662) 50(6,-7.662) 76(6,7.662) 77(5.5,7.662) 78(5,7.662) 79(4.5,7.662) 80(4,7.662) 81(3.5,7.662) 82(3,7.662) 83(2.5,7.662) 84(2,7.662) 85(1.5,7.662) 86(1,7.662) 87(0.5,7.662) 88(0,7.662) 89(-0.5,7.662) 90(-1,7.662) 91(-1.5,7.662) 92(-2,7.662) 93(-2.5,7.662) 94(-3,7.662) 95(-3.5,7.662) 96(-4,7.662) 97(-4.5,7.662) 98(-5,7.662) 99(-5.5,7.662) 100(-6,7.662)
  rect 5x5 smd: 101(0,0)
  rrect25% 1.01x1.01 on Top Paste: Un1(1.875,0.625) Un2(0.625,0.625) Un3(0.625,-0.625) Un4(-1.875,1.875) Un5(-1.875,-1.875) Un6(-1.875,-0.625) Un7(1.875,1.875) Un8(-0.625,1.875) Un9(0.625,1.875) Un10(-1.875,0.625) Un11(1.875,-1.875) Un12(-0.625,-1.875) Un13(-0.625,-0.625) Un14(-0.625,0.625) Un15(0.625,-1.875) Un16(1.875,-0.625)
F.SilkS:
  lines w0.12: -8.4,6.41 -7.11,6.41 -7.11,7.11 -6.41,7.11 ; -7.11,-6.41 -7.11,-7.11 -6.41,-7.11 ; 6.41,-7.11 7.11,-7.11 7.11,-6.41 ; 6.41,7.11 7.11,7.11 7.11,6.41
F.CrtYd:
  lines w0.05: -8.65,-6.4 -7.25,-6.4 -7.25,-7.25 -6.4,-7.25 -6.4,-8.65 0,-8.65 6.4,-8.65 6.4,-7.25 7.25,-7.25 7.25,-6.4 8.65,-6.4 8.65,0 8.65,6.4 7.25,6.4 7.25,7.25 6.4,7.25 6.4,8.65 0,8.65 -6.4,8.65 -6.4,7.25 -7.25,7.25 -7.25,6.4 -8.65,6.4 -8.65,0 -8.65,-6.4
F.Fab:
  lines w0.1: -7,-7 7,-7 7,7 -6,7 -7,6 -7,-7
  text "'.Designator'" at -4.047,-0.84 h1

## TQFP-100-1EP_14x14mm_P0.5mm_EP5x5mm_ThermalVias [mm]
pads (143):
  rrect25% 1.475x0.3 smd: 1(-7.662,6) 2(-7.662,5.5) 3(-7.662,5) 4(-7.662,4.5) 5(-7.662,4) 6(-7.662,3.5) 7(-7.662,3) 8(-7.662,2.5) 9(-7.662,2) 10(-7.662,1.5) 11(-7.662,1) 12(-7.662,0.5) 13(-7.662,0) 14(-7.662,-0.5) 15(-7.662,-1) 16(-7.662,-1.5) 17(-7.662,-2) 18(-7.662,-2.5) 19(-7.662,-3) 20(-7.662,-3.5) 21(-7.662,-4) 22(-7.662,-4.5) 23(-7.662,-5) 24(-7.662,-5.5) 25(-7.662,-6) 51(7.662,-6) 52(7.662,-5.5) 53(7.662,-5) 54(7.662,-4.5) 55(7.662,-4) 56(7.662,-3.5) 57(7.662,-3) 58(7.662,-2.5) 59(7.662,-2) 60(7.662,-1.5) 61(7.662,-1) 62(7.662,-0.5) 63(7.662,0) 64(7.662,0.5) 65(7.662,1) 66(7.662,1.5) 67(7.662,2) 68(7.662,2.5) 69(7.662,3) 70(7.662,3.5) 71(7.662,4) 72(7.662,4.5) 73(7.662,5) 74(7.662,5.5) 75(7.662,6)
  rrect25% 0.3x1.475 smd: 26(-6,-7.662) 27(-5.5,-7.662) 28(-5,-7.662) 29(-4.5,-7.662) 30(-4,-7.662) 31(-3.5,-7.662) 32(-3,-7.662) 33(-2.5,-7.662) 34(-2,-7.662) 35(-1.5,-7.662) 36(-1,-7.662) 37(-0.5,-7.662) 38(0,-7.662) 39(0.5,-7.662) 40(1,-7.662) 41(1.5,-7.662) 42(2,-7.662) 43(2.5,-7.662) 44(3,-7.662) 45(3.5,-7.662) 46(4,-7.662) 47(4.5,-7.662) 48(5,-7.662) 49(5.5,-7.662) 50(6,-7.662) 76(6,7.662) 77(5.5,7.662) 78(5,7.662) 79(4.5,7.662) 80(4,7.662) 81(3.5,7.662) 82(3,7.662) 83(2.5,7.662) 84(2,7.662) 85(1.5,7.662) 86(1,7.662) 87(0.5,7.662) 88(0,7.662) 89(-0.5,7.662) 90(-1,7.662) 91(-1.5,7.662) 92(-2,7.662) 93(-2.5,7.662) 94(-3,7.662) 95(-3.5,7.662) 96(-4,7.662) 97(-4.5,7.662) 98(-5,7.662) 99(-5.5,7.662) 100(-6,7.662)
  round 0.5 hole 0.2: 101(-2.25,-2.25) 101(-2.25,-1.125) 101(-2.25,0) 101(-2.25,1.125) 101(-2.25,2.25) 101(-1.125,-2.25) 101(-1.125,-1.125) 101(-1.125,0) 101(-1.125,1.125) 101(-1.125,2.25) 101(0,-2.25) 101(0,-1.125) 101(0,0) 101(0,1.125) 101(0,2.25) 101(1.125,-2.25) 101(1.125,-1.125) 101(1.125,0) 101(1.125,1.125) 101(1.125,2.25) 101(2.25,-2.25) 101(2.25,-1.125) 101(2.25,0) 101(2.25,1.125) 101(2.25,2.25)
  rect 5x5 smd: 101(0,0)
  rect 5x5 smd far side: 101(0,0)
  round 0.891 on Top Paste: Un1(-0.563,-1.687) Un2(1.687,0.563) Un3(1.687,-0.563) Un4(-1.687,-0.563) Un5(0.563,1.687) Un6(0.563,-1.687) Un7(0.563,0.563) Un8(-0.563,-0.563) Un9(1.687,-1.687) Un10(-0.563,0.563) Un11(-0.563,1.687) Un12(-1.687,1.687) Un13(-1.687,0.563) Un14(-1.687,-1.687) Un15(0.563,-0.563) Un16(1.687,1.687)
F.SilkS:
  lines w0.12: -8.4,6.41 -7.11,6.41 -7.11,7.11 -6.41,7.11 ; -7.11,-6.41 -7.11,-7.11 -6.41,-7.11 ; 6.41,-7.11 7.11,-7.11 7.11,-6.41 ; 6.41,7.11 7.11,7.11 7.11,6.41
F.Paste:
  region: -0.176,-1.398 -0.176,-1.977 -0.273,-2.074 -0.852,-2.074 -0.949,-1.977 -0.949,-1.398 -0.852,-1.301 -0.273,-1.301
  region: 2.074,0.852 2.074,0.273 1.977,0.176 1.398,0.176 1.301,0.273 1.301,0.852 1.398,0.949 1.977,0.949
  region: 2.074,-0.273 2.074,-0.852 1.977,-0.949 1.398,-0.949 1.301,-0.852 1.301,-0.273 1.398,-0.176 1.977,-0.176
  region: -1.301,-0.273 -1.301,-0.852 -1.398,-0.949 -1.977,-0.949 -2.074,-0.852 -2.074,-0.273 -1.977,-0.176 -1.398,-0.176
  region: 0.949,1.977 0.949,1.398 0.852,1.301 0.273,1.301 0.176,1.398 0.176,1.977 0.273,2.074 0.852,2.074
  region: 0.949,-1.398 0.949,-1.977 0.852,-2.074 0.273,-2.074 0.176,-1.977 0.176,-1.398 0.273,-1.301 0.852,-1.301
  region: 0.949,0.852 0.949,0.273 0.852,0.176 0.273,0.176 0.176,0.273 0.176,0.852 0.273,0.949 0.852,0.949
  region: -0.176,-0.273 -0.176,-0.852 -0.273,-0.949 -0.852,-0.949 -0.949,-0.852 -0.949,-0.273 -0.852,-0.176 -0.273,-0.176
  region: 2.074,-1.398 2.074,-1.977 1.977,-2.074 1.398,-2.074 1.301,-1.977 1.301,-1.398 1.398,-1.301 1.977,-1.301
  region: -0.176,0.852 -0.176,0.273 -0.273,0.176 -0.852,0.176 -0.949,0.273 -0.949,0.852 -0.852,0.949 -0.273,0.949
  region: -0.176,1.977 -0.176,1.398 -0.273,1.301 -0.852,1.301 -0.949,1.398 -0.949,1.977 -0.852,2.074 -0.273,2.074
  region: -1.301,1.977 -1.301,1.398 -1.398,1.301 -1.977,1.301 -2.074,1.398 -2.074,1.977 -1.977,2.074 -1.398,2.074
  region: -1.301,0.852 -1.301,0.273 -1.398,0.176 -1.977,0.176 -2.074,0.273 -2.074,0.852 -1.977,0.949 -1.398,0.949
  region: -1.301,-1.398 -1.301,-1.977 -1.398,-2.074 -1.977,-2.074 -2.074,-1.977 -2.074,-1.398 -1.977,-1.301 -1.398,-1.301
  region: 0.949,-0.273 0.949,-0.852 0.852,-0.949 0.273,-0.949 0.176,-0.852 0.176,-0.273 0.273,-0.176 0.852,-0.176
  region: 2.074,1.977 2.074,1.398 1.977,1.301 1.398,1.301 1.301,1.398 1.301,1.977 1.398,2.074 1.977,2.074
F.CrtYd:
  lines w0.05: -8.65,-6.4 -8.65,0 -8.65,6.4 -7.25,6.4 -7.25,7.25 -6.4,7.25 -6.4,8.65 0,8.65 6.4,8.65 6.4,7.25 7.25,7.25 7.25,6.4 8.65,6.4 8.65,0 8.65,-6.4 7.25,-6.4 7.25,-7.25 6.4,-7.25 6.4,-8.65 0,-8.65 -6.4,-8.65 -6.4,-7.25 -7.25,-7.25 -7.25,-6.4 -8.65,-6.4
F.Fab:
  lines w0.1: -7,-7 7,-7 7,7 -6,7 -7,6 -7,-7
  text "'.Designator'" at -4.047,-0.84 h1

## TQFP-100_12x12mm_P0.4mm [mm]
pads (100):
  rect 1.5x0.2 smd: 1(-6.7,4.8) 2(-6.7,4.4) 3(-6.7,4) 4(-6.7,3.6) 5(-6.7,3.2) 6(-6.7,2.8) 7(-6.7,2.4) 8(-6.7,2) 9(-6.7,1.6) 10(-6.7,1.2) 11(-6.7,0.8) 12(-6.7,0.4) 13(-6.7,0) 14(-6.7,-0.4) 15(-6.7,-0.8) 16(-6.7,-1.2) 17(-6.7,-1.6) 18(-6.7,-2) 19(-6.7,-2.4) 20(-6.7,-2.8) 21(-6.7,-3.2) 22(-6.7,-3.6) 23(-6.7,-4) 24(-6.7,-4.4) 25(-6.7,-4.8) 51(6.7,-4.8) 52(6.7,-4.4) 53(6.7,-4) 54(6.7,-3.6) 55(6.7,-3.2) 56(6.7,-2.8) 57(6.7,-2.4) 58(6.7,-2) 59(6.7,-1.6) 60(6.7,-1.2) 61(6.7,-0.8) 62(6.7,-0.4) 63(6.7,0) 64(6.7,0.4) 65(6.7,0.8) 66(6.7,1.2) 67(6.7,1.6) 68(6.7,2) 69(6.7,2.4) 70(6.7,2.8) 71(6.7,3.2) 72(6.7,3.6) 73(6.7,4) 74(6.7,4.4) 75(6.7,4.8)
  rect 0.2x1.5 smd: 26(-4.8,-6.7) 27(-4.4,-6.7) 28(-4,-6.7) 29(-3.6,-6.7) 30(-3.2,-6.7) 31(-2.8,-6.7) 32(-2.4,-6.7) 33(-2,-6.7) 34(-1.6,-6.7) 35(-1.2,-6.7) 36(-0.8,-6.7) 37(-0.4,-6.7) 38(0,-6.7) 39(0.4,-6.7) 40(0.8,-6.7) 41(1.2,-6.7) 42(1.6,-6.7) 43(2,-6.7) 44(2.4,-6.7) 45(2.8,-6.7) 46(3.2,-6.7) 47(3.6,-6.7) 48(4,-6.7) 49(4.4,-6.7) 50(4.8,-6.7) 76(4.8,6.7) 77(4.4,6.7) 78(4,6.7) 79(3.6,6.7) 80(3.2,6.7) 81(2.8,6.7) 82(2.4,6.7) 83(2,6.7) 84(1.6,6.7) 85(1.2,6.7) 86(0.8,6.7) 87(0.4,6.7) 88(0,6.7) 89(-0.4,6.7) 90(-0.8,6.7) 91(-1.2,6.7) 92(-1.6,6.7) 93(-2,6.7) 94(-2.4,6.7) 95(-2.8,6.7) 96(-3.2,6.7) 97(-3.6,6.7) 98(-4,6.7) 99(-4.4,6.7) 100(-4.8,6.7)
F.SilkS:
  lines w0.15: -7.45,5.2 -6.175,5.2 -6.175,6.175 -5.125,6.175 ; -6.175,-5.125 -6.175,-6.175 -5.125,-6.175 ; 5.125,-6.175 6.175,-6.175 6.175,-5.125 ; 5.125,6.175 6.175,6.175 6.175,5.125
F.CrtYd:
  lines w0.05: -7.7,-7.7 7.7,-7.7 7.7,7.7 -7.7,7.7 -7.7,-7.7
F.Fab:
  lines w0.15: -6,-6 6,-6 6,6 -5,6 -6,5 -6,-6
  text "'.Designator'" at -4.047,-0.84 h1

## TQFP-100_14x14mm_P0.5mm [mm]
pads (100):
  rrect25% 1.475x0.3 smd: 1(-7.662,6) 2(-7.662,5.5) 3(-7.662,5) 4(-7.662,4.5) 5(-7.662,4) 6(-7.662,3.5) 7(-7.662,3) 8(-7.662,2.5) 9(-7.662,2) 10(-7.662,1.5) 11(-7.662,1) 12(-7.662,0.5) 13(-7.662,0) 14(-7.662,-0.5) 15(-7.662,-1) 16(-7.662,-1.5) 17(-7.662,-2) 18(-7.662,-2.5) 19(-7.662,-3) 20(-7.662,-3.5) 21(-7.662,-4) 22(-7.662,-4.5) 23(-7.662,-5) 24(-7.662,-5.5) 25(-7.662,-6) 51(7.662,-6) 52(7.662,-5.5) 53(7.662,-5) 54(7.662,-4.5) 55(7.662,-4) 56(7.662,-3.5) 57(7.662,-3) 58(7.662,-2.5) 59(7.662,-2) 60(7.662,-1.5) 61(7.662,-1) 62(7.662,-0.5) 63(7.662,0) 64(7.662,0.5) 65(7.662,1) 66(7.662,1.5) 67(7.662,2) 68(7.662,2.5) 69(7.662,3) 70(7.662,3.5) 71(7.662,4) 72(7.662,4.5) 73(7.662,5) 74(7.662,5.5) 75(7.662,6)
  rrect25% 0.3x1.475 smd: 26(-6,-7.662) 27(-5.5,-7.662) 28(-5,-7.662) 29(-4.5,-7.662) 30(-4,-7.662) 31(-3.5,-7.662) 32(-3,-7.662) 33(-2.5,-7.662) 34(-2,-7.662) 35(-1.5,-7.662) 36(-1,-7.662) 37(-0.5,-7.662) 38(0,-7.662) 39(0.5,-7.662) 40(1,-7.662) 41(1.5,-7.662) 42(2,-7.662) 43(2.5,-7.662) 44(3,-7.662) 45(3.5,-7.662) 46(4,-7.662) 47(4.5,-7.662) 48(5,-7.662) 49(5.5,-7.662) 50(6,-7.662) 76(6,7.662) 77(5.5,7.662) 78(5,7.662) 79(4.5,7.662) 80(4,7.662) 81(3.5,7.662) 82(3,7.662) 83(2.5,7.662) 84(2,7.662) 85(1.5,7.662) 86(1,7.662) 87(0.5,7.662) 88(0,7.662) 89(-0.5,7.662) 90(-1,7.662) 91(-1.5,7.662) 92(-2,7.662) 93(-2.5,7.662) 94(-3,7.662) 95(-3.5,7.662) 96(-4,7.662) 97(-4.5,7.662) 98(-5,7.662) 99(-5.5,7.662) 100(-6,7.662)
F.SilkS:
  lines w0.12: -8.4,6.41 -7.11,6.41 -7.11,7.11 -6.41,7.11 ; -7.11,-6.41 -7.11,-7.11 -6.41,-7.11 ; 6.41,-7.11 7.11,-7.11 7.11,-6.41 ; 6.41,7.11 7.11,7.11 7.11,6.41
F.CrtYd:
  lines w0.05: -8.65,-6.4 -7.25,-6.4 -7.25,-7.25 -6.4,-7.25 -6.4,-8.65 0,-8.65 6.4,-8.65 6.4,-7.25 7.25,-7.25 7.25,-6.4 8.65,-6.4 8.65,0 8.65,6.4 7.25,6.4 7.25,7.25 6.4,7.25 6.4,8.65 0,8.65 -6.4,8.65 -6.4,7.25 -7.25,7.25 -7.25,6.4 -8.65,6.4 -8.65,0 -8.65,-6.4
F.Fab:
  lines w0.1: -7,-7 7,-7 7,7 -6,7 -7,6 -7,-7
  text "'.Designator'" at -4.047,-0.84 h1